# Altium footprint library brew_pcb_lib.PcbLib: 11 footprints
Each footprint in its own frame and in the unit in brackets; x right, y up, seen from the top. Pads: shape width x height; smd on the part's side, far side on the other; paste and mask are expansions set on the pad; w line width, h text height; cw(c..) or ccw(c..) is an arc to the next point about the centre after c.
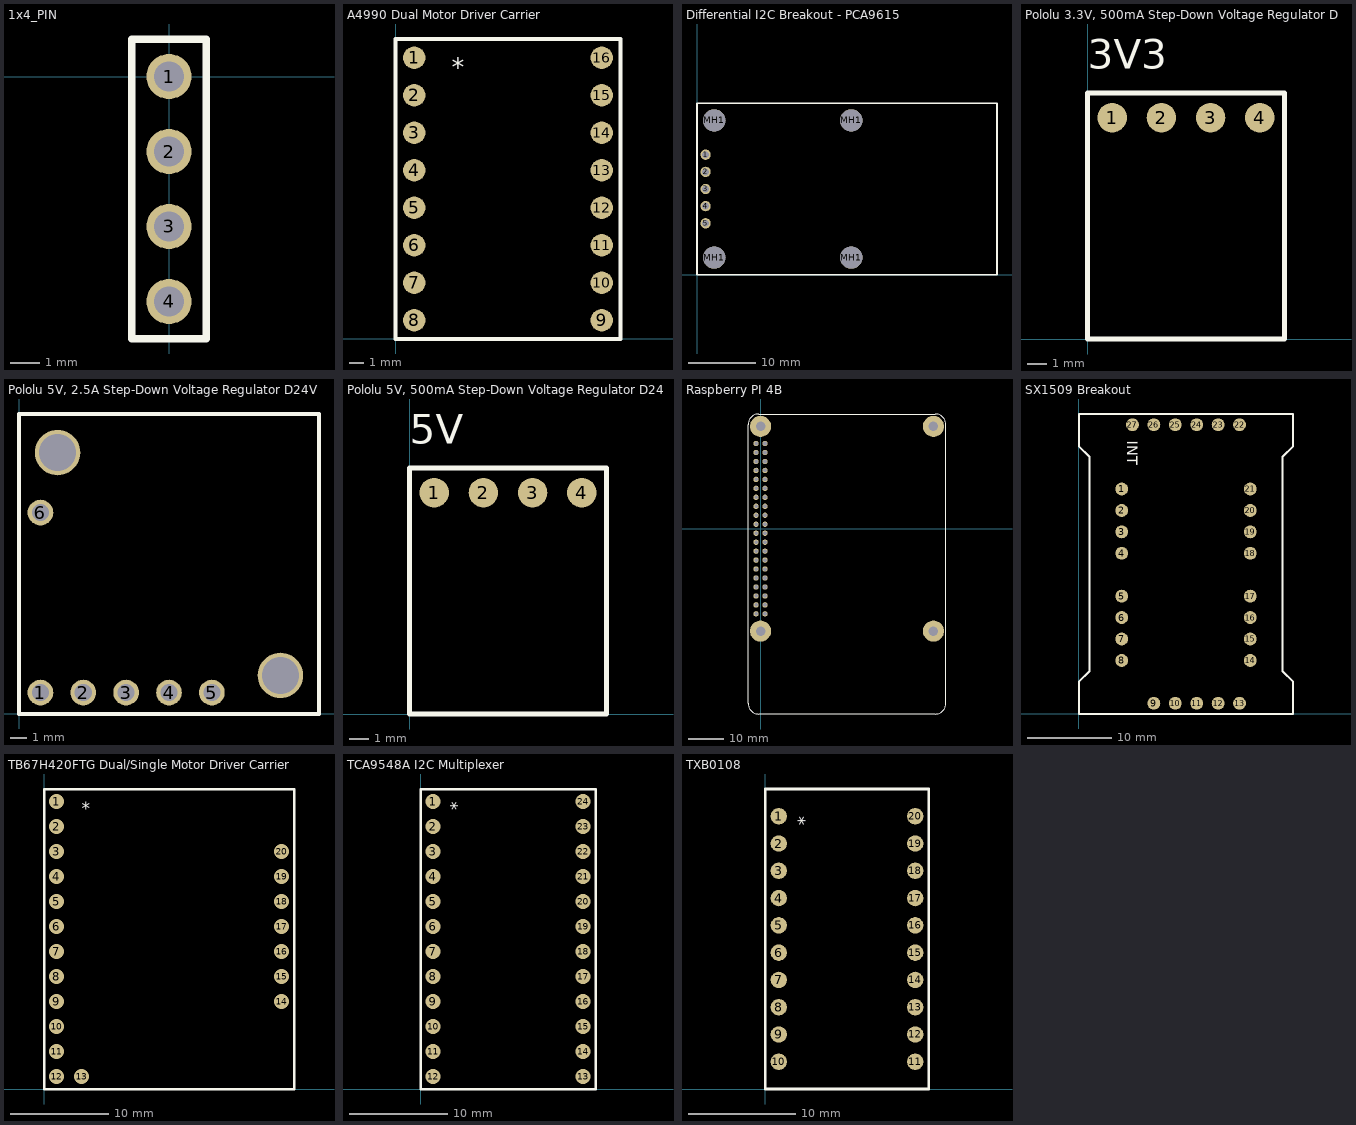
[diagram p0: the footprints below, top view; thin cyan lines are the x and y axes]

## 1x4_PIN [mil]
pads (4):
  round 60 hole 40: 1(0,0) 2(0,-100) 3(0,-200) 4(0,-300)
Top Overlay:
  lines w10: -50,-350 -50,50 50,50 50,-350 -50,-350

## A4990 Dual Motor Driver Carrier [mil]
pads (16):
  round 60 smd: 1(50,750) 2(50,650) 3(50,550) 4(50,450) 5(50,350) 6(50,250) 7(50,150) 8(50,50) 9(550,50) 10(550,150) 11(550,250) 12(550,350) 13(550,450) 14(550,550) 15(550,650) 16(550,750)
Top Overlay:
  lines w10: 0,0 600,0 600,800 0,800 0,0
  text "*" at 150,700 h50
3D body "a4990-dual-motor-driver-carrier.step": height 110.87, standoff 0, extent 0,0 600,800

## Differential I2C Breakout - PCA9615 [mil]
pads (9):
  round 60 hole 40: 1(50,700) 2(50,600) 3(50,500) 4(50,400) 5(50,300)
  round 130 hole 130 unplated: MH1(100,100) MH1(100,900) MH1(900,100) MH1(900,900)
Top Overlay:
  lines w10: 0,0 1750,0 1750,1000 0,1000 0,0

## Pololu 3.3V, 500mA Step-Down Voltage Regulator D24V5F3 - duplicate [mil]
pads (4):
  round 60 smd: 1(50,450) 2(150,450) 3(250,450) 4(350,450)
Top Overlay:
  lines w10: 0,0 0,500 400,500 400,0 0,0
  text "3V3" at 0,550 h60
3D body "d24v5fx-step-down-voltage-regulator.step": height 110.87, standoff 0, extent 0,0 400,500

## Pololu 5V, 2.5A Step-Down Voltage Regulator D24V22F5 [mil]
pads (8):
  round 60 hole 40: 1(50,50) 2(150,50) 3(250,50) 4(350,50) 5(450,50) 6(50,470)
  round 106 hole 86: ""(90,610) ""(610,90)
Top Overlay:
  lines w10: 0,0 700,0 700,700 0,700 0,0
3D body "d24v22fx-step-down-voltage-regulator.step": height 330.29, standoff 6.69, extent 0,0 700,700

## Pololu 5V, 500mA Step-Down Voltage Regulator D24V5F5 [mil]
pads (4):
  round 60 smd: 1(50,450) 2(150,450) 3(250,450) 4(350,450)
Top Overlay:
  lines w10: 0,0 0,500 400,500 400,0 0,0
  text "5V" at 0,550 h60
3D body "d24v5fx-step-down-voltage-regulator.step": height 110.87, standoff 0, extent 0,0 400,500

## Raspberry PI 4B [mil]
pads (44):
  round 60 hole 40: 1(50,950) 2(-50,950) 3(50,850) 4(-50,850) 5(50,750) 6(-50,750) 7(50,650) 8(-50,650) 9(50,550) 10(-50,550) 11(50,450) 12(-50,450) 13(50,350) 14(-50,350) 15(50,250) 16(-50,250) 17(50,150) 18(-50,150) 19(50,50) 20(-50,50) 21(50,-50) 22(-50,-50) 23(50,-150) 24(-50,-150) 25(50,-250) 26(-50,-250) 27(50,-350) 28(-50,-350) 29(50,-450) 30(-50,-450) 31(50,-550) 32(-50,-550) 33(50,-650) 34(-50,-650) 35(50,-750) 36(-50,-750) 37(50,-850) 38(-50,-850) 39(50,-950) 40(-50,-950)
  round 236.22 hole 106.3: ""(0,-1141.73) ""(0,1141.73) ""(1929.13,-1141.73) ""(1929.13,1141.73)
Top Overlay:
  lines w10: -137.8,-1948.82 ccw(c-19.68,-1948.82) -19.69,-2066.93 1948.82,-2066.93 ccw(c1948.82,-1948.82) 2066.93,-1948.82 2066.93,1161.42 ccw(c1948.82,1161.42) 1948.82,1279.53 -19.68,1279.53 ccw(c-19.68,1161.42) -137.8,1161.42 -137.8,-1948.82
3D body "Raspberry Pi 4 Model B.STEP": height 507.87, standoff -275.59, extent -137.8,-2224.01 2161.42,1279.53

## SX1509 Breakout [mil]
pads (27):
  round 60 smd: 1(200,1050) 2(200,950) 3(200,850) 4(200,750) 5(200,550) 6(200,450) 7(200,350) 8(200,250) 9(350,50) 10(450,50) 11(550,50) 12(650,50) 13(750,50) 14(800,250) 15(800,350) 16(800,450) 17(800,550) 18(800,750) 19(800,850) 20(800,950) 21(800,1050) 22(750,1350) 23(650,1350) 24(550,1350) 25(450,1350) 26(350,1350) 27(250,1350)
Top Overlay:
  lines w10: 0,0 0,150 50,200 50,1200 0,1250 0,1400 1000,1400 1000,1250 950,1200 950,1000 950,200 1000,150 1000,0 0,0
  text "INT" at 225,1275 h50

## TB67H420FTG Dual/Single Motor Driver Carrier [mil]
pads (20):
  round 60 smd: 1(50,1150) 2(50,1050) 3(50,950) 4(50,850) 5(50,750) 6(50,650) 7(50,550) 8(50,450) 9(50,350) 10(50,250) 11(50,150) 12(50,50) 13(150,50) 14(950,350) 15(950,450) 16(950,550) 17(950,650) 18(950,750) 19(950,850) 20(950,950)
Top Overlay:
  lines w10: 0,0 0,1200 1000,1200 1000,0 0,0
  text "*" at 150,1100 h50
3D body "tb67h420ftg-dual-single-motor-driver-carrier.step": height 302.16, standoff 0, extent 0,0 1000,1200

## TCA9548A I2C Multiplexer [mil]
pads (24):
  round 60 smd: 1(50,1150) 2(50,1050) 3(50,950) 4(50,850) 5(50,750) 6(50,650) 7(50,550) 8(50,450) 9(50,350) 10(50,250) 11(50,150) 12(50,50) 13(650,50) 14(650,150) 15(650,250) 16(650,350) 17(650,450) 18(650,550) 19(650,650) 20(650,750) 21(650,850) 22(650,950) 23(650,1050) 24(650,1150)
Top Overlay:
  lines w10: 0,0 700,0 700,1200 0,1200 0,0
  text "*" at 100,1150 h50

## TXB0108 [mil]
pads (20):
  round 60 smd: 1(50,1000) 2(50,900) 3(50,800) 4(50,700) 5(50,600) 6(50,500) 7(50,400) 8(50,300) 9(50,200) 10(50,100) 11(550,100) 12(550,200) 13(550,300) 14(550,400) 15(550,500) 16(550,600) 17(550,700) 18(550,800) 19(550,900) 20(550,1000)
Top Overlay:
  lines w10: 0,0 600,0 600,1100 0,1100 0,0
  text "*" at 100,1000 h50